# Altium footprint library PERCRO_footprints.PcbLib: 177 footprints (part 6 of 12)
Each footprint in its own frame and in the unit in brackets; x right, y up, seen from the top. Pads: shape width x height; smd on the part's side, far side on the other; paste and mask are expansions set on the pad; w line width, h text height; cw(c..) or ccw(c..) is an arc to the next point about the centre after c.
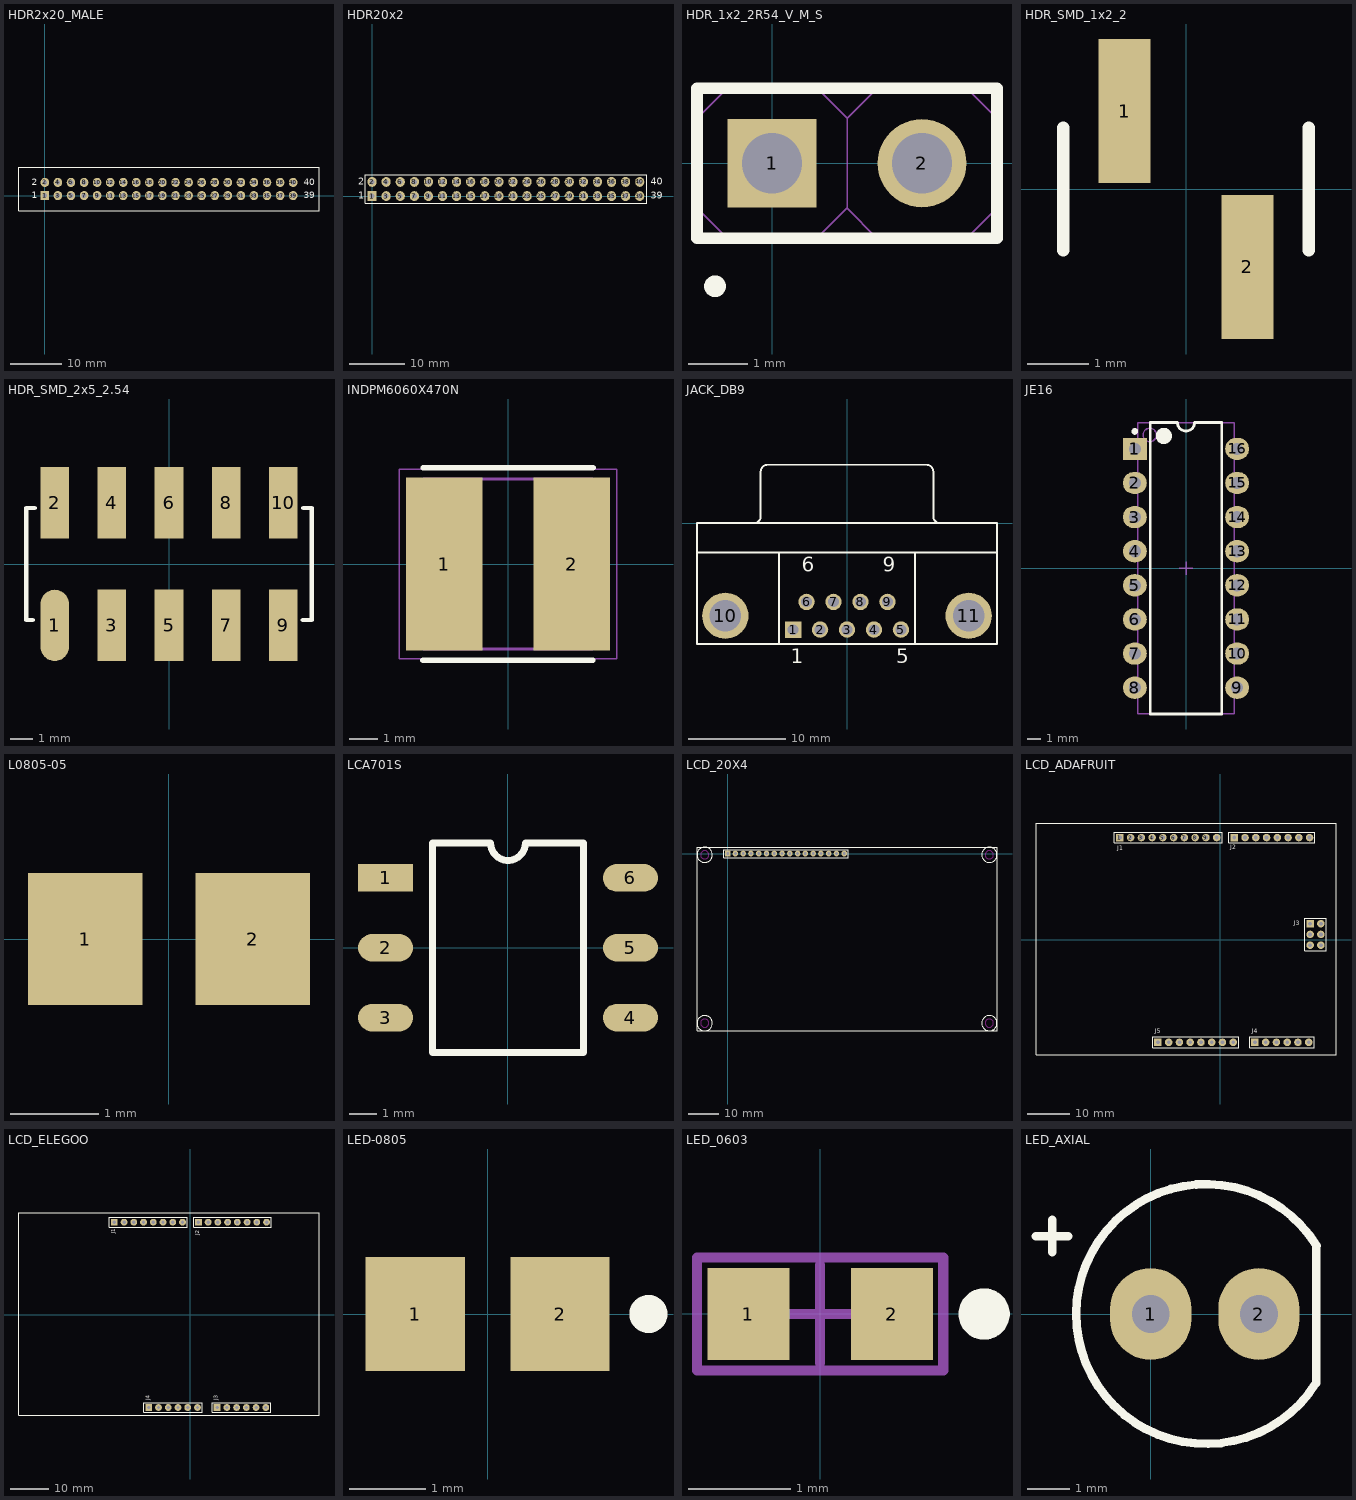
[diagram p5: the footprints below, top view; thin cyan lines are the x and y axes]

## HDR2x20_MALE [mil] "Connector; Header; 20x2 Position"
pads (40):
  rect 65x70 hole 35.43: 1(0,0)
  oval 65x70 hole 35.43: 2(0,100) 3(100,0) 4(100,100) 5(200,0) 6(200,100) 7(300,0) 8(300,100) 9(400,0) 10(400,100) 11(500,0) 12(500,100) 13(600,0) 14(600,100) 15(700,0) 16(700,100) 17(800,0) 18(800,100) 19(900,0) 20(900,100) 21(1000,0) 22(1000,100) 23(1100,0) 24(1100,100) 25(1200,0) 26(1200,100) 27(1300,0) 28(1300,100) 29(1400,0) 30(1400,100) 31(1500,0) 32(1500,100) 33(1600,0) 34(1600,100) 35(1700,0) 36(1700,100) 37(1800,0) 38(1800,100) 39(1900,0) 40(1900,100)
Top Overlay:
  lines w7.87: -197.64,-117.32 -197.64,217.32 2097.64,217.32 2097.64,-117.32 -197.64,-117.32
  text "39" at 1980,-20 h50
  text "40" at 1980,80 h50
  text "2" at -100,80 h50
  text "1" at -100,-20 h50
3D body "hif3fc-40pa-2_54dsa_71_.stp": height 362.2, standoff -110.24, extent -197.63,-117.31 2097.65,217.33

## HDR20x2 [mil] "Connector; Header; 20x2 Position"
pads (40):
  rect 65x70 hole 35.43: 1(0,0)
  oval 65x70 hole 35.43: 2(0,100) 3(100,0) 4(100,100) 5(200,0) 6(200,100) 7(300,0) 8(300,100) 9(400,0) 10(400,100) 11(500,0) 12(500,100) 13(600,0) 14(600,100) 15(700,0) 16(700,100) 17(800,0) 18(800,100) 19(900,0) 20(900,100) 21(1000,0) 22(1000,100) 23(1100,0) 24(1100,100) 25(1200,0) 26(1200,100) 27(1300,0) 28(1300,100) 29(1400,0) 30(1400,100) 31(1500,0) 32(1500,100) 33(1600,0) 34(1600,100) 35(1700,0) 36(1700,100) 37(1800,0) 38(1800,100) 39(1900,0) 40(1900,100)
Top Overlay:
  lines w7.87: -50,-50 -50,150 1950,150 1950,-50 -50,-50
  text "39" at 1980,-20 h50
  text "40" at 1980,80 h50
  text "2" at -100,80 h50
  text "1" at -100,-20 h50
3D body "Female_Header_2x20.step": height 334.65, standoff -102.36, extent -53.93,-50.78 1957.88,146.07

## HDR_1x2_2R54_V_M_S [mm] "Male Header, Pitch 2.54mm, 4x1 Position, Mated Height 6mm, Tail Length 3mm"
height 6
pads (2):
  rect 1.5x1.5 hole 1.02: 1(0,0)
  round 1.5 hole 1.02: 2(2.54,0)
Top Overlay:
  circle w0.25: c-0.965,-2.083 r0.059
  lines w0.2: -1.27,-1.27 -1.27,1.27 3.81,1.27 3.81,-1.27 -1.27,-1.27
Mechanical 13:
  lines w0.025: 3.81,-0.762 3.302,-1.27 ; 3.81,0.762 3.302,1.27 1.778,1.27 1.27,0.762 ; -1.27,-0.762 -1.27,0.762 ; -1.27,-0.762 -1.27,0.762 ; -1.27,-0.762 -0.762,-1.27 ; -1.27,0.762 -0.762,1.27 0.762,1.27 1.27,0.762 ; -0.762,-1.27 0.762,-1.27 ; -0.762,-1.27 0.762,-1.27 ; 0.762,-1.27 1.27,-0.762 ; 1.27,-0.762 1.27,0.762 ; 1.27,-0.762 1.27,0.762 ; 1.27,-0.762 1.27,0.762 ; 1.27,-0.762 1.27,0.762 ; 1.27,-0.762 1.778,-1.27 ; 1.778,-1.27 3.302,-1.27 ; 1.778,-1.27 3.302,-1.27
3D body: height 2.54, standoff 0, extent -1.27,-1.27 1.27,1.27
3D body: height 9, standoff -3, extent -0.35,-0.349 0.347,0.349
3D body: height 2.54, standoff 0, extent 1.27,-1.27 3.81,1.27
3D body: height 9, standoff -3, extent 2.19,-0.349 2.887,0.349

## HDR_SMD_1x2_2 [mm] "Header SMD, 2-Pin, 2mm Pitch"
pads (2):
  rect 0.85x2.35 smd: 1(-1,1.27) 2(1,-1.27)
Top Overlay:
  lines w0.2: -2,-1 -2,1 ; 2,-1 2,1

## HDR_SMD_2x5_2.54 [mil]
pads (10):
  oval 50x125 smd: 1(-200,-107.5)
  rect 50x125 smd: 2(-200,107.5) 3(-100,-107.5) 4(-100,107.5) 5(0,-107.5) 6(0,107.5) 7(100,-107.5) 8(100,107.5) 9(200,-107.5) 10(200,107.5)
Top Overlay:
  lines w7.87: -238.13,-98 -250,-98 -250,98 -235.18,98 ; 234.19,-98 250,-98 250,98 235.18,98
3D body "SMD HEADER 2x5.stp": height 383.6, standoff 0, extent -250,-147.28 250,148

## INDPM6060X470N [mm]
pads (2):
  rect 2.7x6.1 smd: 1(-2.25,0) 2(2.25,0)
Top Overlay:
  lines w0.2: -3.003,-3.404 2.997,-3.404 ; -2.997,3.404 3.003,3.404
Mechanical 15:
  lines w0.1: -3,-3 -3,3 3,3 3,-3 -3,-3
Mechanical 20:
  lines w0.05: -3.85,-3.35 -3.85,3.35 3.85,3.35 3.85,-3.35 -3.85,-3.35
3D body "SRN6045HA-100M.stp": height 4.7, standoff 0, extent -3,-3 3,3

## JACK_DB9 [mm] "Jack DB9 para soldar en ángulo recto"
pads (11):
  rect 1.69x1.69 hole 1.09: 1(-5.54,-10.92)
  round 1.69 hole 1.09: 2(-2.77,-10.92) 3(0,-10.92) 4(2.77,-10.92) 5(5.54,-10.92) 6(-4.155,-8.08) 7(-1.385,-8.08) 8(1.385,-8.08) 9(4.155,-8.08)
  round 4.76 hole 3.26: 10(-12.495,-9.5) 11(12.495,-9.5)
Top Overlay:
  lines w0.2: -15.4,-3 15.4,-3 ; -9.56,0.005 ccw(c-9.56,0.7) -8.865,0.7 -8.865,5.3 ; -8.86,5.305 cw(c-8.165,5.305) -8.165,6 8.165,6 cw(c8.165,5.305) 8.86,5.305 ; -7,-12.4 -7,-3 ; 7,-12.4 7,-3 ; 8.865,5.3 8.865,0.7 ccw(c9.56,0.7) 9.56,0.005 ; -15.4,-12.4 -15.4,0 15.4,0 15.4,-12.4 -15.4,-12.4
  text "1" at -5.79,-14.375 h1.5
  text "5" at 5.04,-14.375 h1.5
  text "9" at 3.655,-4.975 h1.5
  text "6" at -4.655,-4.975 h1.5
3D body "JACK_DB9.STEP": height 12.45, standoff 0.03, extent -15.545,-12.145 15.555,5.82

## JE16 [mil] "DIP, 16-Leads, Row Spacing 7.62mm, Pitch 2.54mm, Body 20.37x6.73mm"
height 200
pads (16):
  rect 70x65 hole 35.43: 1(-150,350)
  oval 70x65 hole 35.43: 2(-150,250) 3(-150,150) 4(-150,50) 5(-150,-50) 6(-150,-150) 7(-150,-250) 8(-150,-350) 9(150,-350) 10(150,-250) 11(150,-150) 12(150,-50) 13(150,50) 14(150,150) 15(150,250) 16(150,350)
Top Overlay:
  circle w23.62: c-64.96,387.8 r11.81
  circle w9.84: c-150,401.18 r4.92
  lines w7.87: -104.33,-427.17 104.33,-427.17 104.33,427.17 25,427.17 cw(c0,427.17) -25,427.17 -104.33,427.17 -104.33,-427.17
Mechanical 13:
  circle w3.94: c-106.3,390.75 r19.68
  lines w3.94: -141.73,-426.18 141.73,-426.18 141.73,426.18 -141.73,426.18 -141.73,-426.18
Mechanical 15:
  lines w3.94: -19.68,0 19.68,0 ; 0,-19.68 0,19.68
3D body: height 200, standoff 0, extent -141.73,-426.18 141.73,426.18

## L0805-05 [mm] "Inductor"
height 1.27
pads (2):
  rect 1.3x1.5 smd: 1(-0.95,0) 2(0.95,0)
3D body "Inductor L0805-05.step": height 1.3, standoff 0, extent -1,-0.6 1,0.6

## LCA701S [mm]
pads (6):
  rect 2x1 smd: 1(-4.45,2.54)
  oval 2x1 smd: 2(-4.45,0) 3(-4.45,-2.54) 4(4.45,-2.54) 5(4.45,0) 6(4.45,2.54)
Top Overlay:
  lines w0.254: -2.736,-3.81 2.736,-3.81 2.736,3.81 0.635,3.81 cw(c0,3.81) -0.635,3.81 -2.736,3.81 -2.736,-3.81
3D body "LCA701.STEP": height 4.44, standoff 0, extent -4.81,-4.217 4.74,4.163

## LCD_20X4 [mil]
pads (16):
  rect 70x75 hole 35.43: 1(0,0)
  oval 70x75 hole 35.43: 2(100,0) 3(200,0) 4(300,0) 5(400,0) 6(500,0) 7(600,0) 8(700,0) 9(800,0) 10(900,0) 11(1000,0) 12(1100,0) 13(1200,0) 14(1300,0) 15(1400,0) 16(1500,0)
Top Overlay:
  circle w10: c3366.21,-2181.89 r98.43
  circle w10: c-295.21,-2181.89 r98.43
  circle w10: c-295.21,-16.43 r98.43
  circle w10: c3366.21,-16.43 r98.43
  lines w7.87: -52,-52 -52,52 1552,52 1552,-52 -52,-52
  lines w10: -394,-2280.32 3465,-2280.32 3465,82 -394,82 -394,-2280.32
Keep-Out Layer:
  circle w10: c-295.21,-16.43 r53.15
  circle w10: c-295.21,-2181.78 r53.15
  circle w10: c3366.21,-16.43 r53.15
  circle w10: c3366.21,-2181.78 r53.15
3D body "LCD2004.step": height 880.43, standoff 406.02, extent -393.69,-2280.2 3464.58,82.01

## LCD_ADAFRUIT [mil] "LCD ADAFRUIT 2.8 in"
pads (38):
  rect 70x70 hole 35: 1(-934,951.18) 11(129,951.18) 19(834,151.18) 30(321.12,-951.18) 38(-580.45,-951.18)
  round 70 hole 35: 2(-834,951.18) 3(-734,951.18) 4(-634,951.18) 5(-534,951.18) 6(-434,951.18) 7(-334,951.18) 8(-234,951.18) 9(-134,951.18) 10(-34,951.18) 12(229,951.18) 13(329,951.18) 14(429,951.18) 15(529,951.18) 16(629,951.18) 17(729,951.18) 18(829,951.18) 20(934,151.18) 21(834,51.18) 22(934,51.18) 23(834,-48.82) 24(934,-48.82) 25(821.12,-951.18) 26(721.12,-951.18) 27(621.12,-951.18) 28(521.12,-951.18) 29(421.12,-951.18) 31(119.55,-951.18) 32(19.55,-951.18) 33(-80.45,-951.18) 34(-180.45,-951.18) 35(-280.45,-951.18) 36(-380.45,-951.18) 37(-480.45,-951.18)
Top Overlay:
  lines w7.87: -985.5,901.18 16,901.18 16,1001.18 -985.5,1001.18 -985.5,901.18 ; -630.5,-1001.18 -630.5,-901.18 169.55,-901.18 169.55,-1001.18 -630.5,-1001.18 ; 79,901.18 879,901.18 879,1001.18 79,1001.18 79,901.18 ; 271.12,-1001.18 271.12,-901.18 871.12,-901.18 871.12,-1001.18 271.12,-1001.18
  lines w10: -1713.5,-1065 1074.5,-1065 1074.5,1082 -1713.5,1082 -1713.5,-1065 ; 783.5,-99 783.5,201.36 984.49,201.36 984.49,-99 783.5,-99
  text "J2" at 90.65,841.26 h40
  text "J4" at 290,-869 h40
  text "J3" at 682,136 h40
  text "J1" at -958,834 h40
  text "J5" at -611.57,-869 h40
3D body "10129381-906002BLF.stp": height 322.05, standoff -98.03, extent 788.93,-98.81 979.08,201.19
3D body "Adafruit-1947-2.8in TFT.STEP": height 657.09, standoff 48.99, extent -1713.12,-1064.16 1074.28,1081.5

## LCD_ELEGOO [mil] "LCD Elegoo 2.8 in"
pads (28):
  rect 70x70 hole 35: 1(-781.5,951.18) 9(81.5,951.18) 22(273.62,-951.18) 28(-427.95,-951.18)
  round 70 hole 35: 2(-681.5,951.18) 3(-581.5,951.18) 4(-481.5,951.18) 5(-381.5,951.18) 6(-281.5,951.18) 7(-181.5,951.18) 8(-81.5,951.18) 10(181.5,951.18) 11(281.5,951.18) 12(381.5,951.18) 13(481.5,951.18) 14(581.5,951.18) 15(681.5,951.18) 16(781.5,951.18) 17(773.62,-951.18) 18(673.62,-951.18) 19(573.62,-951.18) 20(473.62,-951.18) 21(373.62,-951.18) 23(72.05,-951.18) 24(-27.95,-951.18) 25(-127.95,-951.18) 26(-227.95,-951.18) 27(-327.95,-951.18)
Top Overlay:
  lines w7.87: -831.5,901.18 -831.5,1001.18 -31.5,1001.18 -31.5,901.18 -831.5,901.18 ; -477.95,-1001.18 122.05,-1001.18 122.05,-901.18 -477.95,-901.18 -477.95,-1001.18 ; 31.5,901.18 831.5,901.18 831.5,1001.18 31.5,1001.18 31.5,901.18 ; 223.62,-1001.18 823.62,-1001.18 823.62,-901.18 223.62,-901.18 223.62,-1001.18
  lines w10: -1760,-1028.74 1319.69,-1028.74 1319.69,1046.06 -1760,1046.06 -1760,-1028.74
  text "J3" at 280,-875 h40
  text "J2" at 90,815 h40
  text "J1" at -770,830 h40
  text "J4" at -420,-875 h40
3D body "female_header_a-bl254-eg-g08d.stp": height 334.65, standoff -125.98, extent 26.58,901.98 836.43,1000.4
3D body "female_header_a-bl254-eg-g06d.stp": height 334.65, standoff -125.98, extent 218.71,-1000.38 828.55,-901.96
3D body "female_header_a-bl254-eg-g06d.stp": height 330.27, standoff -130.36, extent -482.86,-1000.39 126.98,-901.96
3D body "female_header_a-bl254-eg-g08d.stp": height 334.65, standoff -125.98, extent -836.41,901.98 -26.56,1000.4
3D body "Elegoo_2.8_TFT_LCD_Display.stp": height 759.84, standoff 94.49, extent -1761.34,-1035.35 1321.33,1047.33

## LED-0805 [mm]
pads (2):
  rect 1.3x1.5 smd: 1(-0.95,0) 2(0.95,0)
Top Overlay:
  circle w0.25: c2.108,0 r0.125
3D body "Led 0603.STEP": height 0.9, standoff 0, extent -0.85,-0.45 0.85,0.45

## LED_0603 [mm]
pads (2):
  rect 0.8x0.9 smd: 1(-0.7,0) 2(0.7,0)
Top Overlay:
  circle w0.25: c1.6,0 r0.125
Mechanical 15:
  lines w0.1: -0.475,0 0.475,0 ; 0,-0.475 0,0.475 ; -1.2,-0.55 1.2,-0.55 1.2,0.55 -1.2,0.55 -1.2,-0.55
3D body "Led 0603.STEP": height 0.9, standoff 0, extent -0.85,-0.45 0.85,0.45

## LED_AXIAL [mil]
pads (2):
  oval 75x85 hole 35: 1(0,0) 2(100,0)
Top Overlay:
  lines w7.87: -106,72 -76,72 ; -91,57 -91,87 ; 152.78,-63.86 cw(c51.18,0) 153.23,63.14 ; 153,-63.86 153,63.14
3D body "LED_AXIAL_AMARILLO.step": height 1167.32, standoff -157.48, extent -66.14,-116.13 148.43,116.15